# Altium footprint library разъёмы.PcbLib: 129 footprints (part 5 of 9)
Each footprint in its own frame and in the unit in brackets; x right, y up, seen from the top. Pads: shape width x height; smd on the part's side, far side on the other; paste and mask are expansions set on the pad; w line width, h text height; cw(c..) or ccw(c..) is an arc to the next point about the centre after c.
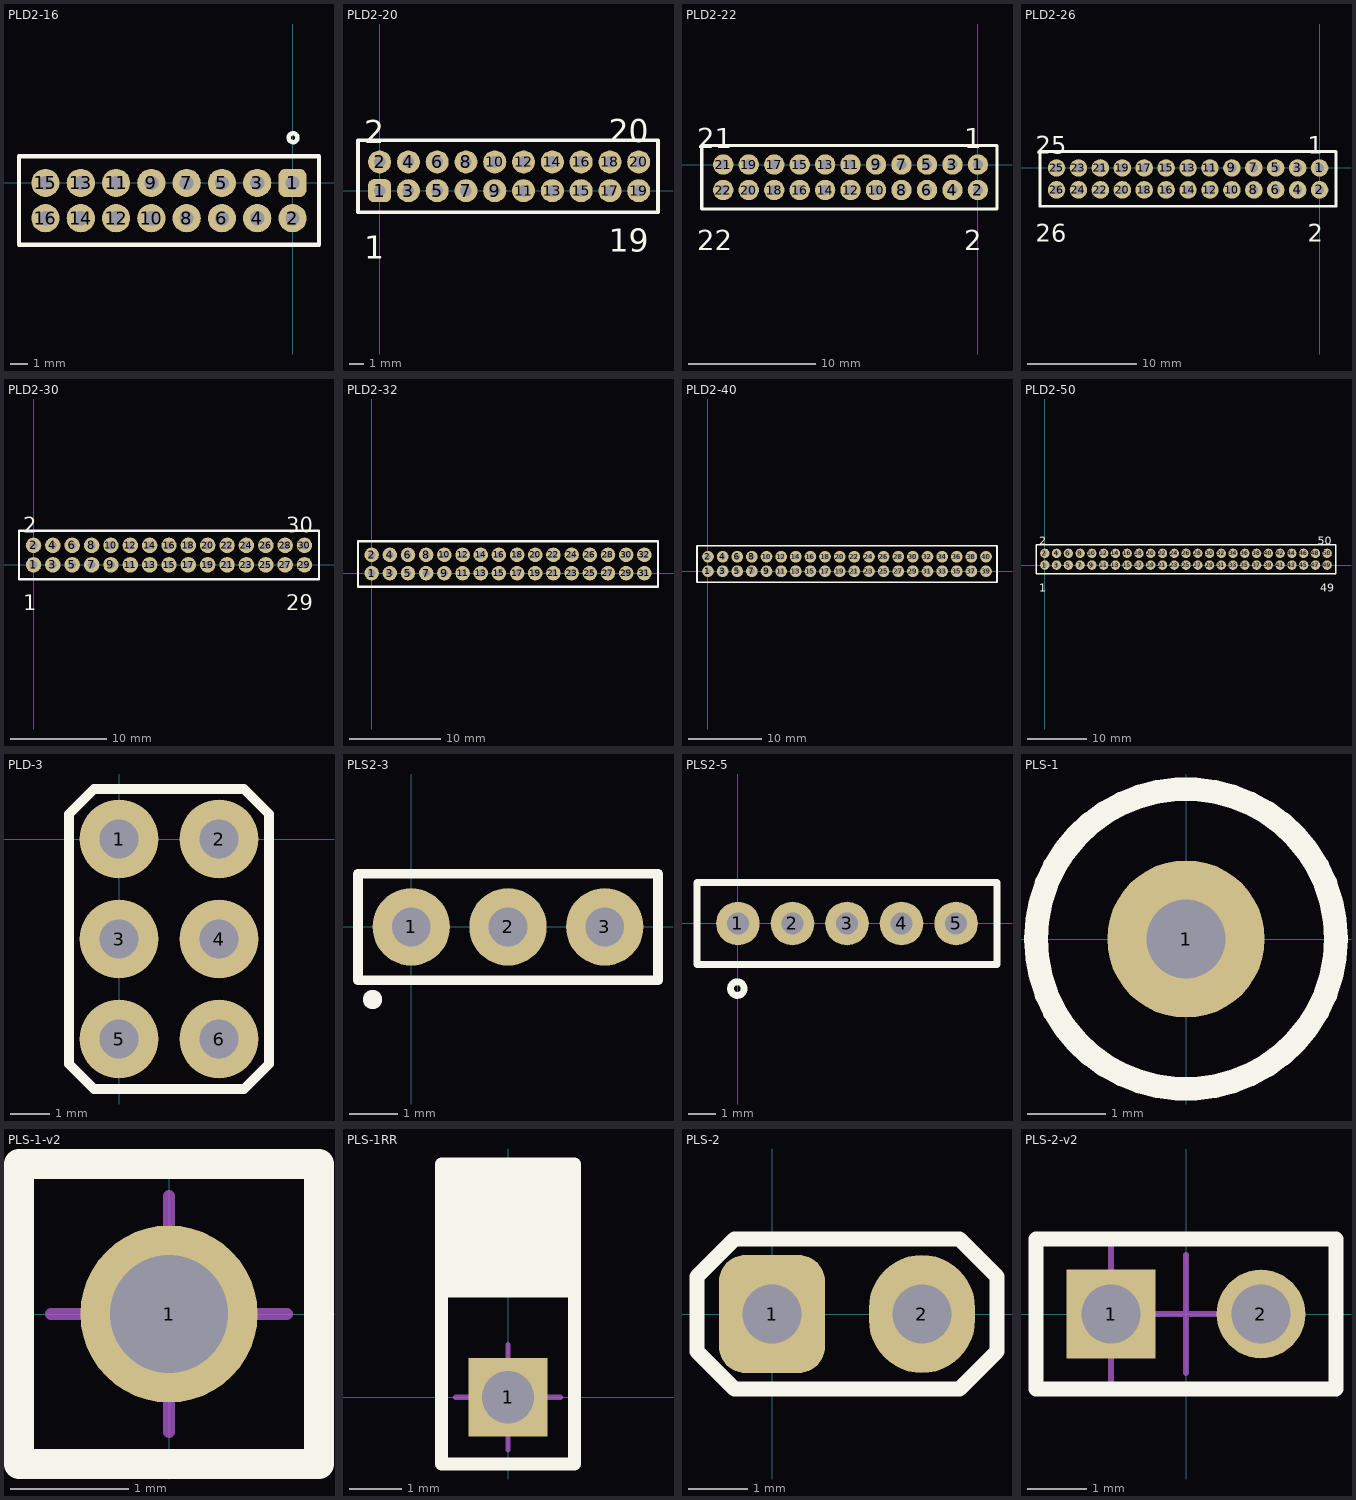
[diagram p4: the footprints below, top view; thin cyan lines are the x and y axes]

## PLD2-16 [mm]
pads (16):
  rrect50% 1.6x1.6 hole 0.8: 1(0,0)
  round 1.6 hole 0.8: 2(0,-2) 3(-2,0) 4(-2,-2) 5(-4,0) 6(-4,-2) 7(-6,0) 8(-6,-2) 9(-8,0) 10(-8,-2) 11(-10,0) 12(-10,-2) 13(-12,0) 14(-12,-2) 15(-14,0) 16(-14,-2)
Top Overlay:
  circle w0.25: c0.03,2.56 r0.25
  lines w0.254: -15.5,-3.5 1.5,-3.5 1.5,1.5 -15.5,1.5 -15.5,-3.5

## PLD2-20 [mm]
pads (20):
  rrect50% 1.6x1.6 hole 0.8: 1(0,0)
  round 1.6 hole 0.8: 2(0,2) 3(2,0) 4(2,2) 5(4,0) 6(4,2) 7(6,0) 8(6,2) 9(8,0) 10(8,2) 11(10,0) 12(10,2) 13(12,0) 14(12,2) 15(14,0) 16(14,2) 17(16,0) 18(16,2) 19(18,0) 20(18,2)
Top Overlay:
  lines w0.254: -1.5,-1.5 19.34,-1.5 19.34,3.5 -1.5,3.5 -1.5,-1.5
  text "20" at 15.907,3.365 h1.59
  text "19" at 15.907,-4.255 h1.59
  text "2" at -1.079,3.286 h1.59
  text "1" at -1.079,-4.714 h1.59

## PLD2-22 [mm]
pads (22):
  round 1.6 hole 0.8: 1(0,0) 2(0,-2) 3(-2,0) 4(-2,-2) 5(-4,0) 6(-4,-2) 7(-6,0) 8(-6,-2) 9(-8,0) 10(-8,-2) 11(-10,0) 12(-10,-2) 13(-12,0) 14(-12,-2) 15(-14,0) 16(-14,-2) 17(-16,0) 18(-16,-2) 19(-18,0) 20(-18,-2) 21(-20,0) 22(-20,-2)
Top Overlay:
  lines w0.254: -21.69,-3.5 1.5,-3.5 1.5,1.5 -21.69,1.5 -21.69,-3.5
  text "1" at -1.079,1.285 h1.59
  text "2" at -1.079,-6.715 h1.59
  text "21" at -22.063,1.285 h1.59
  text "22" at -22.063,-6.715 h1.59

## PLD2-26 [mm]
pads (26):
  round 1.6 hole 0.8: 1(0,0) 2(0,-2) 3(-2,0) 4(-2,-2) 5(-4,0) 6(-4,-2) 7(-6,0) 8(-6,-2) 9(-8,0) 10(-8,-2) 11(-10,0) 12(-10,-2) 13(-12,0) 14(-12,-2) 15(-14,0) 16(-14,-2) 17(-16,0) 18(-16,-2) 19(-18,0) 20(-18,-2) 21(-20,0) 22(-20,-2) 23(-22,0) 24(-22,-2) 25(-24,0) 26(-24,-2)
Top Overlay:
  lines w0.254: -25.5,-3.5 1.5,-3.5 1.5,1.5 -25.5,1.5 -25.5,-3.5
  text "1" at -1.079,1.285 h1.59
  text "2" at -1.079,-6.715 h1.59
  text "25" at -25.873,1.285 h1.59
  text "26" at -25.873,-6.715 h1.59

## PLD2-30 [mm]
pads (30):
  round 1.6 hole 0.8: 1(0,0) 2(0,2) 3(2,0) 4(2,2) 5(4,0) 6(4,2) 7(6,0) 8(6,2) 9(8,0) 10(8,2) 11(10,0) 12(10,2) 13(12,0) 14(12,2) 15(14,0) 16(14,2) 17(16,0) 18(16,2) 19(18,0) 20(18,2) 21(20,0) 22(20,2) 23(22,0) 24(22,2) 25(24,0) 26(24,2) 27(26,0) 28(26,2) 29(28,0) 30(28,2)
Top Overlay:
  lines w0.254: -1.5,-1.5 29.5,-1.5 29.5,3.5 -1.5,3.5 -1.5,-1.5
  text "2" at -1.079,3.286 h1.59
  text "1" at -1.079,-4.714 h1.59
  text "30" at 26.127,3.286 h1.59
  text "29" at 26.127,-4.714 h1.59

## PLD2-32 [mm]
pads (32):
  round 1.6 hole 0.8: 1(0,0) 2(0,2) 3(2,0) 4(2,2) 5(4,0) 6(4,2) 7(6,0) 8(6,2) 9(8,0) 10(8,2) 11(10,0) 12(10,2) 13(12,0) 14(12,2) 15(14,0) 16(14,2) 17(16,0) 18(16,2) 19(18,0) 20(18,2) 21(20,0) 22(20,2) 23(22,0) 24(22,2) 25(24,0) 26(24,2) 27(26,0) 28(26,2) 29(28,0) 30(28,2) 31(30,0) 32(30,2)
Top Overlay:
  lines w0.254: -1.5,-1.5 31.5,-1.5 31.5,3.5 -1.5,3.5 -1.5,-1.5

## PLD2-40 [mm]
pads (40):
  round 1.6 hole 0.8: 1(0,0) 2(0,2) 3(2,0) 4(2,2) 5(4,0) 6(4,2) 7(6,0) 8(6,2) 9(8,0) 10(8,2) 11(10,0) 12(10,2) 13(12,0) 14(12,2) 15(14,0) 16(14,2) 17(16,0) 18(16,2) 19(18,0) 20(18,2) 21(20,0) 22(20,2) 23(22,0) 24(22,2) 25(24,0) 26(24,2) 27(26,0) 28(26,2) 29(28,0) 30(28,2) 31(30,0) 32(30,2) 33(32,0) 34(32,2) 35(34,0) 36(34,2) 37(36,0) 38(36,2) 39(38,0) 40(38,2)
Top Overlay:
  lines w0.254: -1.5,-1.5 39.5,-1.5 39.5,3.5 -1.5,3.5 -1.5,-1.5

## PLD2-50 [mm]
pads (50):
  round 1.6 hole 0.8: 1(0,0) 2(0,2) 3(2,0) 4(2,2) 5(4,0) 6(4,2) 7(6,0) 8(6,2) 9(8,0) 10(8,2) 11(10,0) 12(10,2) 13(12,0) 14(12,2) 15(14,0) 16(14,2) 17(16,0) 18(16,2) 19(18,0) 20(18,2) 21(20,0) 22(20,2) 23(22,0) 24(22,2) 25(24,0) 26(24,2) 27(26,0) 28(26,2) 29(28,0) 30(28,2) 31(30,0) 32(30,2) 33(32,0) 34(32,2) 35(34,0) 36(34,2) 37(36,0) 38(36,2) 39(38,0) 40(38,2) 41(40,0) 42(40,2) 43(42,0) 44(42,2) 45(44,0) 46(44,2) 47(46,0) 48(46,2) 49(48,0) 50(48,2)
Top Overlay:
  lines w0.254: -1.5,-1.5 -1.5,3.5 49.5,3.5 49.5,-1.5 -1.5,-1.5
  text "1" at -0.95,-4.5 h1.38
  text "2" at -0.95,3.5 h1.38
  text "49" at 46.862,-4.5 h1.38
  text "50" at 46.363,3.5 h1.38

## PLD-3 [mm]
pads (6):
  round 2 hole 1: 1(0,0) 2(2.54,0) 3(0,-2.54) 4(2.54,-2.54) 5(0,-5.08) 6(2.54,-5.08)
Top Overlay:
  lines w0.254: -1.27,-5.715 -1.27,0.635 -0.635,1.27 3.175,1.27 3.81,0.635 3.81,-5.715 3.175,-6.35 -0.635,-6.35 -1.27,-5.715

## PLS2-3 [mm]
pads (3):
  round 1.6 hole 0.8 mask+0.025: 1(0,0) 2(2,0) 3(4,0)
Top Overlay:
  circle w0.2: c-0.8,-1.5 r0.1
  lines w0.2: -1.1,-1.1 -1.1,1.1 5.1,1.1 5.1,-1.1 -1.1,-1.1
3D body "User Library-pls2-3.STEP": height 6, standoff -2.8, extent -1,-1 5,1

## PLS2-5 [mm]
pads (5):
  round 1.6 hole 0.8: 1(0,0) 2(2,0) 3(4,0) 4(6,0) 5(8,0)
Top Overlay:
  circle w0.25: c-0.02,-2.39 r0.25
  lines w0.254: -1.5,-1.5 9.5,-1.5 9.5,1.5 -1.5,1.5 -1.5,-1.5

## PLS-1 [mm]
pads (1):
  round 2 hole 1: 1(0,0)
Top Overlay:
  circle w0.3: c0,0 r1.905

## PLS-1-v2 [mm]
height 10
pads (1):
  round 1.5 hole 1: 1(0,0)
Top Overlay:
  lines w0.25: -1.27,-1.27 1.27,-1.27 1.27,1.27 -1.27,1.27 -1.27,-1.27
Mechanical 13:
  lines w0.1: -1.27,-1.27 -1.27,1.27 1.27,1.27 1.27,-1.27 -1.27,-1.27
Mechanical 15:
  lines w0.1: -1,0 1,0 ; 0,-1 0,1 ; -1.27,-1.27 -1.27,1.27 1.27,1.27 1.27,-1.27 -1.27,-1.27
3D body: height 9, standoff -1, extent -0.3,-0.3 0.3,0.3
3D body: height 2, standoff 0, extent -1.25,-1.25 1.25,1.25

## PLS-1RR [mm]
height 10
pads (1):
  rect 1.5x1.5 hole 1: 1(0,0)
Top Overlay:
  region: 1.27,1.905 1.27,4.445 -1.27,4.445 -1.27,1.905
  lines w0.25: -1.27,-1.27 1.27,-1.27 1.27,4.445 -1.27,4.445 -1.27,-1.27
Mechanical 15:
  lines w0.1: -1,0 1,0 ; 0,-1 0,1 ; -1.27,-1.27 -1.27,4.445 1.27,4.445 1.27,-1.27 -1.27,-1.27
3D body "User Library-Header_Male_RA_Low_1Pin.STEP": height 3.01, standoff -2.5, extent -1.27,-0.32 1.27,9.81

## PLS-2 [mm]
pads (2):
  rrect50% 1.8x2 hole 1: 1(0,0)
  oval 1.8x2 hole 1: 2(2.54,0)
Top Overlay:
  lines w0.254: -1.27,-0.635 -0.635,-1.27 3.175,-1.27 3.81,-0.635 3.81,0.635 3.175,1.27 -0.635,1.27 -1.27,0.635 -1.27,-0.635

## PLS-2-v2 [mm]
height 10
pads (2):
  rect 1.5x1.5 hole 1: 1(-1.27,0)
  round 1.5 hole 1: 2(1.27,0)
Top Overlay:
  lines w0.25: -2.54,-1.27 -2.54,1.27 2.54,1.27 2.54,-1.27 -2.54,-1.27
Mechanical 13:
  lines w0.1: -1.27,-1.27 -1.27,1.27 ; -2.54,-1.27 -2.54,1.27 2.54,1.27 2.54,-1.27 -2.54,-1.27
Mechanical 15:
  lines w0.1: -1,0 1,0 ; 0,-1 0,1 ; -2.54,-1.27 2.54,-1.27 2.54,1.27 -2.54,1.27 -2.54,-1.27
3D body "PLS-2.STEP": height 8.9, standoff -2.9, extent -2.54,-1.27 2.54,1.27